# Altium footprint library JL_PCB.PCBLIB: 1129 footprints (part 61 of 72)
Each footprint in its own frame and in the unit in brackets; x right, y up, seen from the top. Pads: shape width x height; smd on the part's side, far side on the other; paste and mask are expansions set on the pad; w line width, h text height; cw(c..) or ccw(c..) is an arc to the next point about the centre after c.
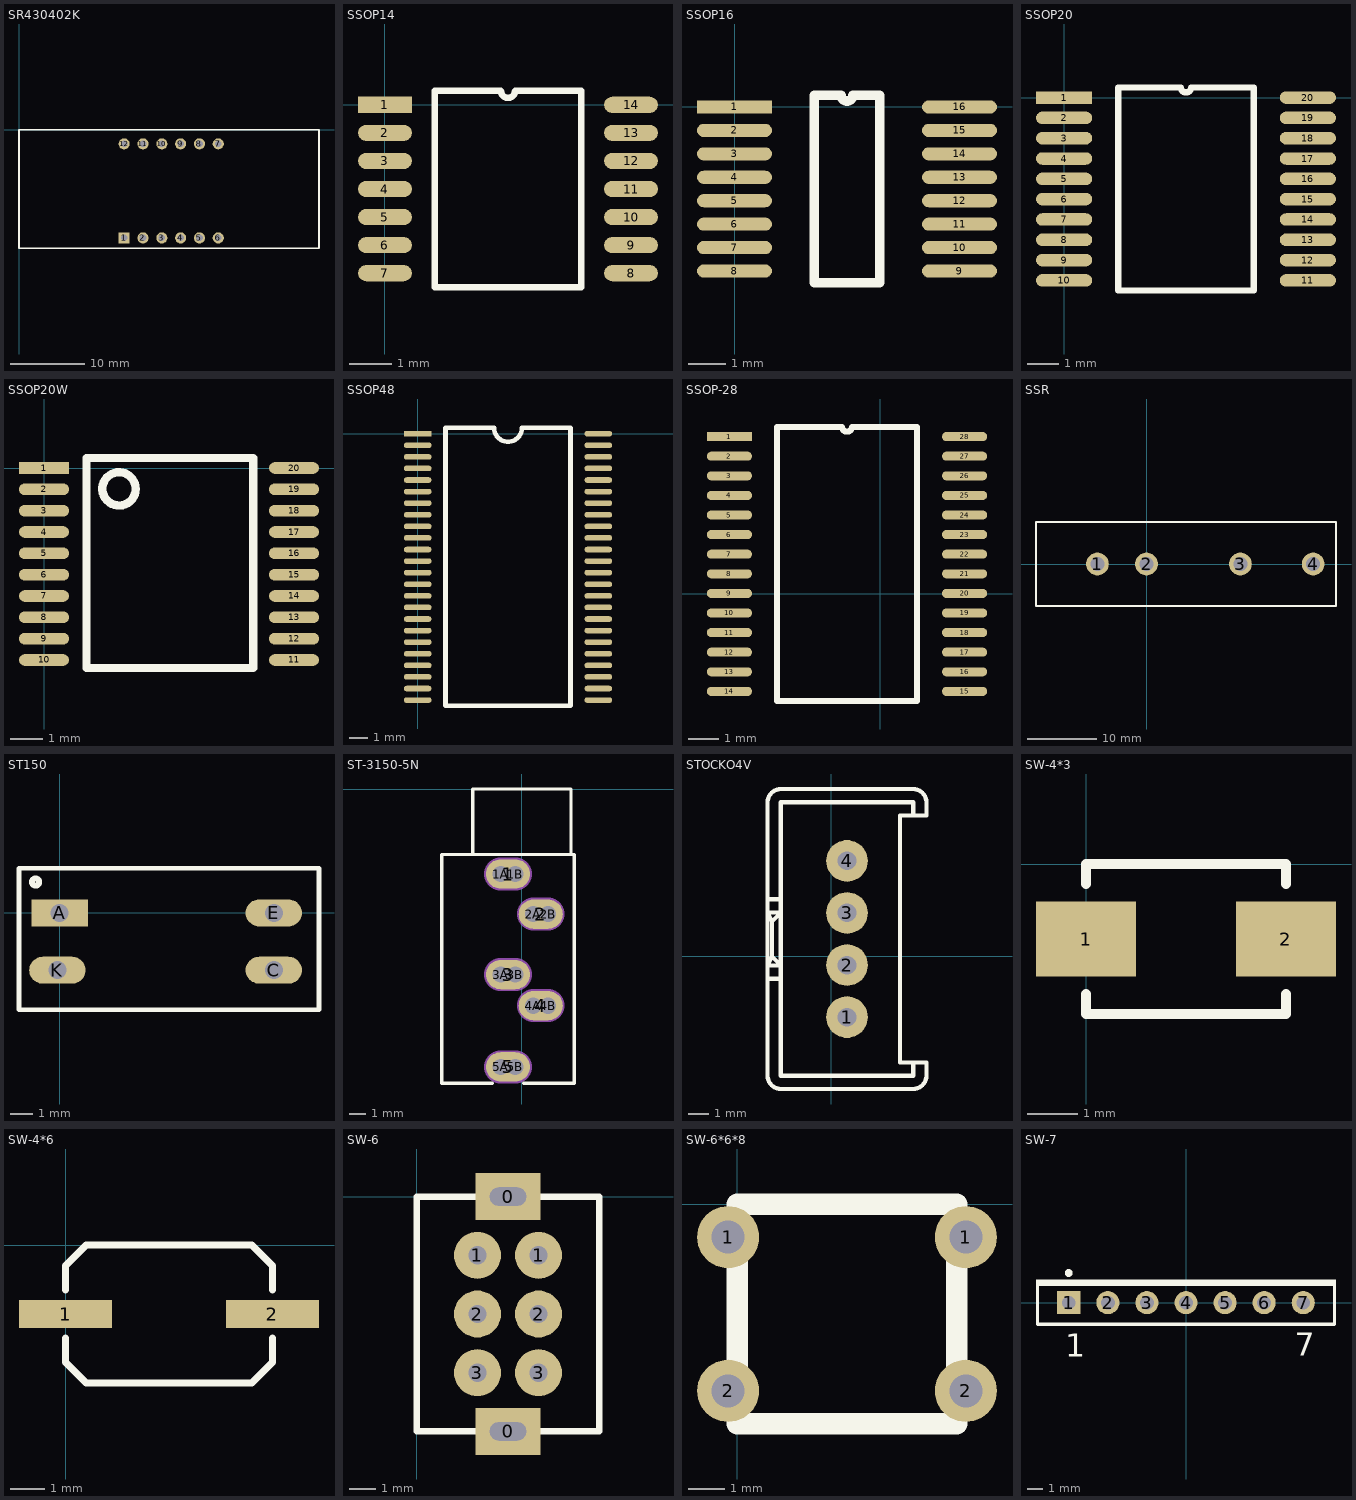
[diagram p60: the footprints below, top view; thin cyan lines are the x and y axes]

## SR430402K [mm]
pads (12):
  rect 1.5x1.5 hole 0.9: 1(14.2,-14.6)
  round 1.5 hole 0.9: 2(16.74,-14.6) 3(19.28,-14.6) 4(21.82,-14.6) 5(24.36,-14.6) 6(26.9,-14.6) 7(26.9,-1.9) 8(24.36,-1.9) 9(21.82,-1.9) 10(19.28,-1.9) 11(16.74,-1.9) 12(14.2,-1.9)
TopOverlay:
  lines w0.203: 0,-16 40.5,-16 40.5,0 0,0 0,-16
3D body "0.4寸8": height 7, standoff -1.1, extent 0.129,-15.975 40.309,0.025

## SSOP14 [mil]
pads (14):
  rect 50x15 smd: 1(0,0)
  oval 50x15 smd: 2(0,-26) 3(0,-52) 4(0,-78) 5(0,-104) 6(0,-130) 7(0,-156) 8(228,-156) 9(228,-130) 10(228,-104) 11(228,-78) 12(228,-52) 13(228,-26) 14(228,0)
TopOverlay:
  lines w6: 46,-169 46,13 107.5,13 ccw(c114,13) 120.5,13 182,13 182,-169 46,-169

## SSOP16 [mil]
pads (16):
  rect 80x14 smd: 1(0,0)
  oval 80x14 smd: 2(0,-25) 3(0,-50) 4(0,-75) 5(0,-100) 6(0,-125) 7(0,-150) 8(0,-175) 9(240,-175) 10(240,-150) 11(240,-125) 12(240,-100) 13(240,-75) 14(240,-50) 15(240,-25) 16(240,0)
TopOverlay:
  lines w10: 85,-187.5 85,12.5 113.75,12.5 ccw(c120,12.5) 126.25,12.5 155,12.5 155,-187.5 85,-187.5
3D body "SSOP-16.STEP": height 43.65, standoff 0.35, extent -20,-184 216,12

## SSOP20 [mm]
pads (20):
  rect 1.8x0.4 smd: 1(0,0)
  oval 1.8x0.4 smd: 2(0,-0.65) 3(0,-1.3) 4(0,-1.95) 5(0,-2.6) 6(0,-3.25) 7(0,-3.9) 8(0,-4.55) 9(0,-5.2) 10(0,-5.85) 11(7.8,-5.85) 12(7.8,-5.2) 13(7.8,-4.55) 14(7.8,-3.9) 15(7.8,-3.25) 16(7.8,-2.6) 17(7.8,-1.95) 18(7.8,-1.3) 19(7.8,-0.65) 20(7.8,0)
TopOverlay:
  lines w0.2: 1.735,-6.175 6.065,-6.175 6.065,0.325 4.063,0.325 cw(c3.9,0.325) 3.737,0.325 1.735,0.325 1.735,-6.175
3D body "SSOP-20.STEP": height 1.98, standoff 0, extent -0.025,-6.604 7.875,0.726

## SSOP20W [mil]
pads (20):
  rect 60x14 smd: 1(0,0)
  oval 60x14 smd: 2(0,-25.59) 3(0,-51.18) 4(0,-76.77) 5(0,-102.36) 6(0,-127.95) 7(0,-153.54) 8(0,-179.13) 9(0,-204.72) 10(0,-230.31) 11(300,-230.31) 12(300,-204.72) 13(300,-179.13) 14(300,-153.54) 15(300,-127.95) 16(300,-102.36) 17(300,-76.77) 18(300,-51.18) 19(300,-25.59) 20(300,0)
TopOverlay:
  circle w10: c90,-25 r20
  lines w10: 51,-240 51,12 251,12 251,-240 51,-240

## SSOP48 [mil]
pads (48):
  rect 60x12 smd: 1(0,0)
  oval 60x12 smd: 2(0,-25) 3(0,-50) 4(0,-75) 5(0,-100) 6(0,-125) 7(0,-150) 8(0,-175) 9(0,-200) 10(0,-225) 11(0,-250) 12(0,-275) 13(0,-300) 14(0,-325) 15(0,-350) 16(0,-375) 17(0,-400) 18(0,-425) 19(0,-450) 20(0,-475) 21(0,-500) 22(0,-525) 23(0,-550) 24(0,-575) 25(390,-575) 26(390,-550) 27(390,-525) 28(390,-500) 29(390,-475) 30(390,-450) 31(390,-425) 32(390,-400) 33(390,-375) 34(390,-350) 35(390,-325) 36(390,-300) 37(390,-275) 38(390,-250) 39(390,-225) 40(390,-200) 41(390,-175) 42(390,-150) 43(390,-125) 44(390,-100) 45(390,-75) 46(390,-50) 47(390,-25) 48(390,0)
TopOverlay:
  lines w10: 60,-587.5 60,12.5 165,12.5 ccw(c195,12.5) 225,12.5 330,12.5 330,-587.5 60,-587.5

## SSOP-28 [mm]
pads (28):
  rect 1.5x0.3 smd: 1(-4.996,5.219)
  oval 1.5x0.3 smd: 2(-4.996,4.569) 3(-4.996,3.919) 4(-4.996,3.269) 5(-4.996,2.619) 6(-4.996,1.969) 7(-4.996,1.319) 8(-4.996,0.669) 9(-4.996,0.019) 10(-4.996,-0.631) 11(-4.996,-1.281) 12(-4.996,-1.931) 13(-4.996,-2.581) 14(-4.996,-3.231) 15(2.804,-3.231) 16(2.804,-2.581) 17(2.804,-1.931) 18(2.804,-1.281) 19(2.804,-0.631) 20(2.804,0.019) 21(2.804,0.669) 22(2.804,1.319) 23(2.804,1.969) 24(2.804,2.619) 25(2.804,3.269) 26(2.804,3.919) 27(2.804,4.569) 28(2.804,5.219)
TopOverlay:
  lines w0.2: -3.411,-3.556 1.219,-3.556 1.219,5.544 -0.934,5.544 cw(c-1.096,5.544) -1.258,5.544 -3.411,5.544 -3.411,-3.556

## SSR [mil]
pads (4):
  round 130 hole 80: 1(-280,0) 2(0,0) 3(535,0) 4(950,0)
TopOverlay:
  lines w10: -630,-240 -630,240 1080,240 1080,-240 -630,-240

## ST150 [mm]
pads (4):
  rect 2.5x1.2 hole 0.8: A(0,0)
  oval 2.5x1.2 hole 0.8: C(9.5,-2.54) E(9.5,0) K(-0.102,-2.54)
TopOverlay:
  circle w0.254: c-1.067,1.372 r0.161
  lines w0.2: -1.803,-4.293 -1.803,1.981 11.506,1.981 11.506,-4.293 -1.803,-4.293
3D body "guangou.STEP": height 9.5, standoff -10.5, extent -1.674,-4.171 11.326,1.829

## ST-3150-5N [mm] "Connector; Stereo Jack, 3.5mm, 5 Position"
pads (15):
  oval 2.7x1.8 all layers, no hole: 1(-0.85,-5.2) 2(1.15,-7.65) 3(-0.85,-11.35) 4(1.15,-13.25) 5(-0.85,-17)
  round 1.2 hole 1: 1A(-1.3,-5.2) 1B(-0.4,-5.2) 2A(0.7,-7.65) 2B(1.6,-7.65) 3A(-1.3,-11.35) 3B(-0.4,-11.35) 4A(0.7,-13.25) 4B(1.6,-13.25) 5A(-1.3,-17) 5B(-0.4,-17)
TopOverlay:
  lines w0.2: -3,-4 -3,0 3,0 3,-4 ; -1.8,-18 -4.9,-18 -4.9,-4 3.2,-4 3.2,-18 0.1,-18
Mechanical1:
  lines w1: -1.3,-17 -0.4,-17 ; -1.3,-11.35 -0.4,-11.35 ; -1.3,-5.2 -0.4,-5.2 ; 0.7,-13.25 1.6,-13.25 ; 0.7,-7.65 1.6,-7.65
Mechanical2:
  lines w2.016: -1.3,-17 -0.4,-17 ; -1.3,-11.35 -0.4,-11.35 ; -1.3,-5.2 -0.4,-5.2 ; 0.7,-13.25 1.6,-13.25 ; 0.7,-7.65 1.6,-7.65

## STOCKO4V [mil]
pads (4):
  round 78.74 hole 35: 1(30,-115) 2(30,-16.67) 3(30,81.67) 4(30,180)
TopOverlay:
  lines w7.87: -120,-225.83 -120,290.83 ; -120,-42.5 -95,-42.5 ; -120,107.5 -95,107.5 ; -95,-250.83 155,-250.83 ; -95,315.83 155,315.83 ; 155,-200.83 155,-225.83 -95,-225.83 -95,290.83 155,290.83 155,265.83 ; 180,-225.83 180,-200.83 130,-200.83 130,265.83 180,265.83 180,290.83 ; -111.67,-0.83 -120,-17.5 -95,-17.5 -111.67,-0.83 ; -111.67,-0.83 -111.67,65.83 ; -111.67,65.83 -120,82.5 -95,82.5 -111.67,65.83
  lines w8: -120,-225.83 ccw(c-95,-225.83) -95,-250.83 ; -120,290.83 cw(c-95,290.83) -95,315.83 ; 155,-250.83 ccw(c155,-225.83) 180,-225.83 ; 155,315.83 cw(c155,290.83) 180,290.83

## SW-4*3 [mm] "SWITCH"
height 4
pads (2):
  rect 2x1.5 smd: 1(0,-1.5) 2(4,-1.5)
TopOverlay:
  lines w0.203: 0,-2.6 0,-3 4,-3 4,-2.6 ; 0,-0.4 0,0 4,0 4,-0.4

## SW-4*6 [mm] "SWITCH"
height 4
pads (2):
  rect 2.7x0.8 smd: 1(0,-2) 2(6,-2)
TopOverlay:
  lines w0.203: 0,-2.7 0,-3.4 0.6,-4 5.4,-4 6,-3.4 ; 0,-1.3 0,-0.6 0.6,0 5.4,0 ; 6,-2.7 6,-3.4 ; 6,-1.3 6,-0.6 5.4,0 ; 5.4,0 5.4,0 ; 5.4,0 5.4,0 ; 6,-3.4 6,-3.4

## SW-6 [mm]
pads (8):
  rect 2.5x1.8 hole 0.7 slot 1.4 at 0 deg: 0(3.5,-9) 0(3.5,0)
  round 1.8 hole 0.7: 1(2.33,-2.25) 1(4.67,-2.25) 2(2.33,-4.5) 2(4.67,-4.5) 3(2.33,-6.75) 3(4.67,-6.75)
TopOverlay:
  lines w0.254: 0,-9 0,0 7,0 7,-9 0,-9
3D body "SW-6.STEP": height 4.42, standoff -3.98, extent -3.631,-9.71 6.569,0.79

## SW-6*6*8 [mm]
pads (4):
  round 1.7 hole 0.9: 1(-0.25,-0.9) 1(6.25,-0.9) 2(-0.25,-5.1) 2(6.25,-5.1)
TopOverlay:
  lines w0.6: 0,-6 0,0 6,0 6,-6 0,-6
3D body "DTS-6 6_6.STEP": height 7.4, standoff -3.5, extent -0.978,-6.097 6.922,0.103

## SW-7 [mm] "6 Way Switch; 7 Leads"
pads (7):
  rect 1.5x1.5 hole 0.9: 1(-7.62,0)
  round 1.5 hole 0.9: 2(-5.08,0) 3(-2.54,0) 4(0,0) 5(2.54,0) 6(5.08,0) 7(7.62,0)
TopOverlay:
  circle w0.25: c-7.625,1.929 r0.125
  rectangle: -9.75,1.1 9.75,1.5
  lines w0.2: -9.65,1.4 -9.65,-1.4 9.65,-1.4 9.65,1.4
  text "1" at -7.851,-3.526 h1.5
  text "7" at 7.084,-3.445 h1.5